# Altium footprint library CPU.PcbLib: 56 footprints (part 1 of 4)
Each footprint in its own frame and in the unit in brackets; x right, y up, seen from the top. Pads: shape width x height; smd on the part's side, far side on the other; paste and mask are expansions set on the pad; w line width, h text height; cw(c..) or ccw(c..) is an arc to the next point about the centre after c.
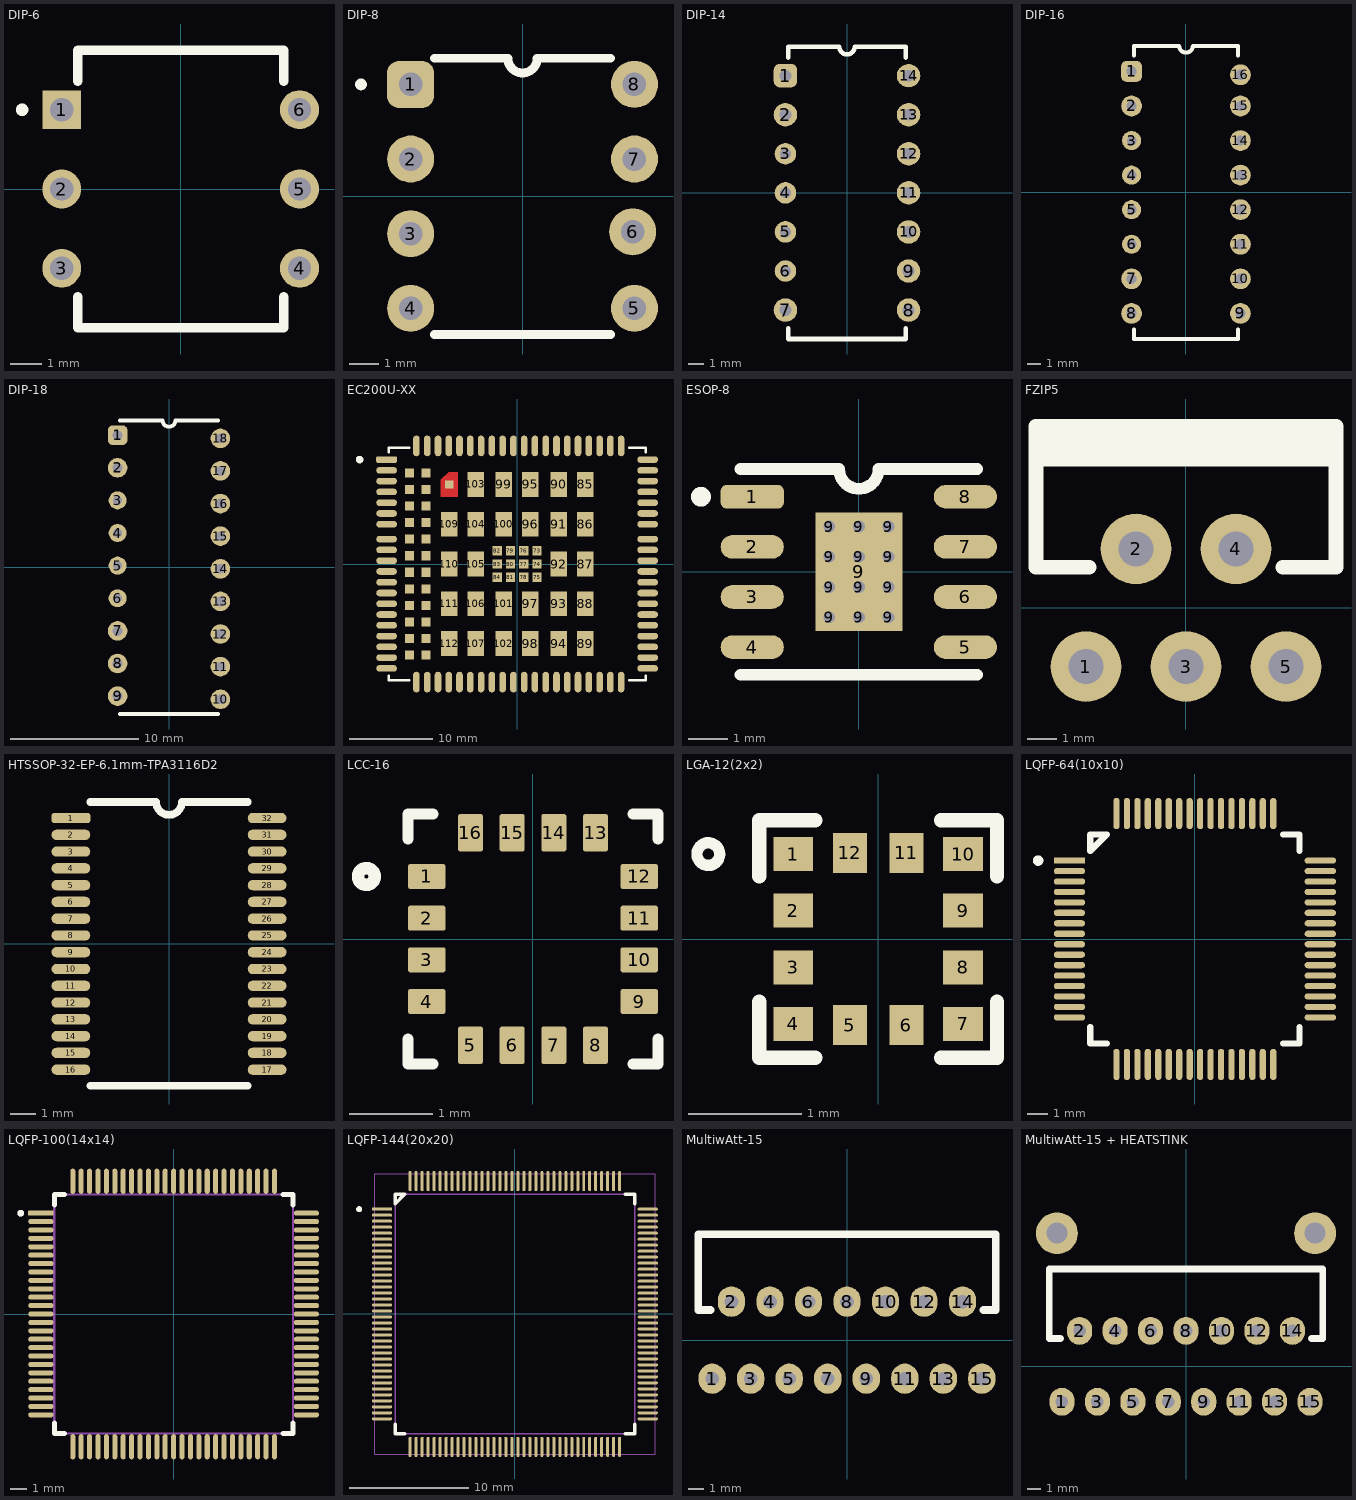
[diagram p0: the footprints below, top view; thin cyan lines are the x and y axes]

## DIP-6 [mm]
pads (6):
  rect 1.248x1.248 hole 0.74: 1(-3.81,2.54)
  round 1.248 hole 0.74: 2(-3.81,0) 3(-3.81,-2.54) 4(3.81,-2.54) 5(3.81,0) 6(3.81,2.54)
Top Overlay:
  circle w0.2: c-5.08,2.54 r0.1
  lines w0.3: -3.3,-3.45 -3.3,-4.45 3.3,-4.45 3.3,-3.45 ; -3.3,3.45 -3.3,4.45 3.3,4.45 3.3,3.45
3D body "MOC3041M.STEP": height 5.08, standoff -3.81, extent -3.935,-4.255 3.935,4.255

## DIP-8 [mm]
pads (8):
  rrect50% 1.6x1.6 hole 0.8: 1(-3.81,3.81)
  round 1.6 hole 0.8: 2(-3.81,1.27) 3(-3.81,-1.27) 4(-3.81,-3.81) 5(3.81,-3.81) 6(3.75,-1.209) 7(3.81,1.27) 8(3.81,3.81)
Top Overlay:
  circle w0.2: c-5.5,3.81 r0.1
  lines w0.3: -3.004,4.7 -0.504,4.7 ; -3,-4.7 3,-4.7 ; -0.5,4.7 ccw(c0,4.7) 0.5,4.7 ; 0.496,4.7 2.996,4.7
3D body "DIP8N.STEP": height 4.09, standoff -2.76, extent -4.254,-4.75 4.273,4.75

## DIP-14 [mil]
pads (14):
  rrect50% 60x60 hole 30 mask+5.91: 1(-157.48,300)
  round 60 hole 30 mask+5.91: 2(-157.48,200) 7(-157.48,-300) 8(157.48,-300) 9(157.48,-200) 10(157.48,-100) 11(157.48,0) 12(157.48,100) 13(157.48,200) 14(157.48,300)
  round 55.12 hole 27.56 mask+5.91: 3(-157.48,100) 4(-157.48,0) 5(-157.48,-100) 6(-157.48,-200)
Top Overlay:
  lines w11.81: -150,-346.46 -150,-374.02 150,-374.02 150,-346.46 ; -150,346.46 -150,374.02 -19.68,374.02 ccw(c0,374.02) 19.68,374.02 150,374.02 150,346.46
3D body "TL084.step": height 173.23, standoff -109.25, extent -154.92,-350 154.92,350

## DIP-16 [mil]
pads (16):
  rrect50% 60x60 hole 30 mask+5.91: 1(-157.48,350)
  round 60 hole 30 mask+5.91: 2(-157.48,250) 7(-157.48,-250) 8(-157.48,-350) 9(157.48,-350) 10(157.48,-250) 11(157.48,-150) 12(157.48,-50) 13(157.48,50) 14(157.48,150) 15(157.48,250) 16(157.48,340.3)
  round 55.12 hole 27.56 mask+5.91: 3(-157.48,150) 4(-157.48,50) 5(-157.48,-50) 6(-157.48,-150)
Top Overlay:
  lines w11.81: -150,-396.46 -150,-424.02 150,-424.02 150,-396.46 ; -150,396.46 -150,424.02 -19.68,424.02 ccw(c0,424.02) 19.69,424.02 150,424.02 150,396.46
3D body "SN74LS47NE4.STEP": height 200, standoff -129.92, extent -155.51,-420.08 155.51,420.08

## DIP-18 [mil]
pads (18):
  rrect50% 60x60 hole 30 mask+5.91: 1(-157.48,404.85)
  round 60 hole 30 mask+5.91: 2(-157.48,304.85) 7(-157.48,-195.15) 8(-157.48,-295.15) 9(-157.48,-395.15) 10(157.48,-404.85) 11(157.48,-304.85) 12(157.48,-204.85) 13(157.48,-104.85) 14(157.48,-4.85) 15(157.48,95.15) 16(157.48,195.15) 17(157.48,295.15) 18(157.48,395.15)
  round 55.12 hole 27.56 mask+5.91: 3(-157.48,204.85) 4(-157.48,104.85) 5(-157.48,4.85) 6(-157.48,-95.15)
Top Overlay:
  lines w11.81: -150,-450 150,-450 ; -150,450 -19.68,450 ccw(c0,450) 19.68,450 150,450
3D body "DIP-18.STEP": height 148.66, standoff -135.98, extent -172.24,-457.48 172.24,457.48

## EC200U-XX [mm]
pads (144):
  rrect50% 2.5x0.8 smd mask+0.15: 1(-15.75,12.6)
  oval 2.5x0.8 smd mask+0.15: 2(-15.75,11.3) 3(-15.75,10) 4(-15.75,8.7) 5(-15.75,7.4) 6(-15.75,6.1) 7(-15.75,4.8) 8(-15.75,0.4) 9(-15.75,-0.9) 10(-15.75,-2.2) 11(-15.75,-3.5) 12(-15.75,-4.8) 13(-15.75,-6.1) 14(-15.75,-7.4) 15(-15.75,-8.7) 16(-15.75,-10) 17(-15.75,-11.3) 18(-15.75,-12.6) 37(15.75,-12.6) 38(15.75,-11.3) 39(15.75,-10) 40(15.75,-8.7) 41(15.75,-7.4) 42(15.75,-6.1) 43(15.75,-4.8) 44(15.75,-3.5) 45(15.75,-2.2) 46(15.75,-0.9) 47(15.75,0.4) 48(15.75,4.8) 49(15.75,6.1) 50(15.75,7.4) 51(15.75,8.7) 52(15.75,10) 53(15.75,11.3) 54(15.75,12.6) 141(-15.75,3) 142(-15.75,1.7) 143(15.75,1.7) 144(15.75,3)
  oval 0.8x2.5 smd mask+0.15: 19(-9.55,-14.25) 20(-8.25,-14.25) 21(-6.95,-14.25) 22(-5.65,-14.25) 23(-4.35,-14.25) 24(-3.05,-14.25) 25(-1.75,-14.25) 26(-0.45,-14.25) 27(0.85,-14.25) 28(2.15,-14.25) 29(3.45,-14.25) 30(4.75,-14.25) 31(6.05,-14.25) 32(7.35,-14.25) 33(8.65,-14.25) 34(9.95,-14.25) 35(11.25,-14.25) 36(12.55,-14.25) 55(12.55,14.25) 56(11.25,14.25) 57(9.95,14.25) 58(8.65,14.25) 59(7.35,14.25) 60(6.05,14.25) 61(4.75,14.25) 62(3.45,14.25) 63(2.15,14.25) 64(0.85,14.25) 65(-0.45,14.25) 66(-1.75,14.25) 67(-3.05,14.25) 68(-4.35,14.25) 69(-5.65,14.25) 70(-6.95,14.25) 71(-8.25,14.25) 72(-9.55,14.25) 113(-10.85,14.25) 114(-12.15,14.25) 115(-10.85,-14.25) 116(-12.15,-14.25)
  rect 1.1x1.1 smd mask+0.15: 73(2.4,1.6) 74(2.4,0) 75(2.4,-1.6) 76(0.8,1.6) 77(0.8,0) 78(0.8,-1.6) 79(-0.8,1.6) 80(-0.8,0) 81(-0.8,-1.6) 82(-2.4,1.6) 83(-2.4,0) 84(-2.4,-1.6) 117(-11,11) 118(-11,9) 119(-11,7) 120(-11,5) 121(-11,3) 122(-11,1) 123(-11,-1) 124(-11,-3) 125(-11,-5) 126(-11,-7) 127(-11,-9) 128(-11,-11) 129(-13,11) 130(-13,9) 131(-13,7) 132(-13,5) 133(-13,3) 134(-13,1) 135(-13,-1) 136(-13,-3) 137(-13,-5) 138(-13,-7) 139(-13,-9) 140(-13,-11)
  rect 2x3 smd mask+0.15: 85(8.2,9.6) 86(8.2,4.8) 87(8.2,0) 88(8.2,-4.8) 89(8.2,-9.6) 90(5,9.6) 91(5,4.8) 92(5,0) 93(5,-4.8) 94(5,-9.6) 95(1.6,9.6) 96(1.6,4.8) 97(1.6,-4.8) 98(1.6,-9.6) 99(-1.6,9.6) 100(-1.6,4.8) 101(-1.6,-4.8) 102(-1.6,-9.6) 103(-5,9.6) 104(-5,4.8) 105(-5,0) 106(-5,-4.8) 107(-5,-9.6) 109(-8.2,4.8) 110(-8.2,0) 111(-8.2,-4.8) 112(-8.2,-9.6)
  rect 1x1 smd paste-1 mask+0: 108(-8.2,9.6)
Top Layer:
  region: -7.15,8.1 -9.2,8.1 -9.2,10.15 -8.25,11.1 -7.15,11.1
Top Overlay:
  circle w0.5: c-19,12.6 r0.2
  lines w0.3: -15.5,-13.5 -15.5,-14 -13,-14 ; -15.5,13.5 -15.5,14 -13,14 ; 13.5,-14 15.5,-14 15.5,-13.5 ; 13.5,14 15.5,14 15.5,13.5
Top Paste:
  region: -7.15,8.1 -9.2,8.1 -9.2,10 -8.1,11.1 -7.15,11.1
Top Solder:
  region: -7,7.95 -9.35,7.95 -9.35,10.25 -8.35,11.25 -7,11.25
3D body "EC200UCNAA-N05-SGNSA--3DModel-STEP-258128.STEP": height 2.55, standoff 0.2, extent -15.5,-14 15.5,14

## ESOP-8 [mm]
height 1.75
pads (21):
  rrect50% 1.6x0.6 smd: 1(-2.7,1.905)
  oval 1.6x0.6 smd: 2(-2.7,0.635) 3(-2.7,-0.635) 4(-2.7,-1.905) 5(2.7,-1.905) 6(2.7,-0.635) 7(2.7,0.635) 8(2.7,1.905)
  round 0.5 hole 0.3: 9(-0.75,-1.15) 9(-0.75,-0.383) 9(-0.75,0.383) 9(-0.75,1.15) 9(0,-1.15) 9(0,-0.383) 9(0,0.383) 9(0,1.15) 9(0.75,-1.15) 9(0.75,-0.383) 9(0.75,0.383) 9(0.75,1.15)
  rect 2.2x3 smd paste-3: 9(0,0)
Top Overlay:
  circle w0.3: c-4,1.905 r0.1
  lines w0.3: -3,-2.605 3,-2.605 ; -3,2.605 -0.5,2.605 ccw(c0,2.605) 0.5,2.605 3,2.605
Top Paste:
  region: 0.763,-1.044 -0.763,-1.044 -0.763,1.044 0.763,1.044
3D:
  circle w0.2: c-4,1.905 r0.1
3D body "step_temp.STEP": height 1.75, standoff 0, extent -3,-2.45 3,2.45

## FZIP5 [mm]
pads (5):
  round 2.4 hole 1.2 mask+0.2: 1(-3.4,-2) 2(-1.7,2) 3(0,-2) 4(1.7,2) 5(3.4,-2)
Top Overlay:
  rectangle: -5.1,4.805 5.1,6.175
  lines w0.5: -3.3,1.375 -5.1,1.375 -5.1,6.175 5.1,6.175 5.1,1.375 3.3,1.375
3D body "TDA2030AV.STEP": height 21.15, standoff -4.55, extent -5.2,-2.325 5.2,6.175

## HTSSOP-32-EP-6.1mm-TPA3116D2 [mm]
pads (32):
  rrect50% 1.5x0.4 smd: 1(-3.8,4.875)
  oval 1.5x0.4 smd: 2(-3.8,4.225) 3(-3.8,3.575) 4(-3.8,2.925) 5(-3.8,2.275) 6(-3.8,1.625) 7(-3.8,0.975) 8(-3.8,0.325) 9(-3.8,-0.325) 10(-3.8,-0.975) 11(-3.8,-1.625) 12(-3.8,-2.275) 13(-3.8,-2.925) 14(-3.8,-3.575) 15(-3.8,-4.225) 16(-3.8,-4.875) 17(3.8,-4.875) 18(3.8,-4.225) 19(3.8,-3.575) 20(3.8,-2.925) 21(3.8,-2.275) 22(3.8,-1.625) 23(3.8,-0.975) 24(3.8,-0.325) 25(3.8,0.325) 26(3.8,0.975) 27(3.8,1.625) 28(3.8,2.275) 29(3.8,2.925) 30(3.8,3.575) 31(3.8,4.225) 32(3.8,4.875)
Top Overlay:
  lines w0.3: -3.05,-5.5 3.05,-5.5 ; -3.05,5.5 -0.5,5.5 ccw(c0,5.5) 0.5,5.5 3.05,5.5
3D body "TPA3116D2.x_b": height 1.16, standoff 0, extent -4.15,-5.55 4.15,5.55

## LCC-16 [mm]
pads (16):
  rrect17% 0.45x0.3 smd mask+0.1: 1(-1.275,0.75) 2(-1.275,0.25) 3(-1.275,-0.25) 4(-1.275,-0.75) 9(1.275,-0.75) 10(1.275,-0.25) 11(1.275,0.25) 12(1.275,0.75)
  rrect17% 0.3x0.45 smd mask+0.1: 5(-0.75,-1.275) 6(-0.25,-1.275) 7(0.25,-1.275) 8(0.75,-1.275) 13(0.75,1.275) 14(0.25,1.275) 15(-0.25,1.275) 16(-0.75,1.275)
Top Overlay:
  circle w0.15: c-2,0.75 r0.1
  lines w0.127: -1.5,-1.2 -1.5,-1.5 -1.2,-1.5 ; -1.5,1.2 -1.5,1.5 -1.2,1.5 ; 1.2,-1.5 1.5,-1.5 1.5,-1.2 ; 1.2,1.5 1.5,1.5 1.5,1.2
3D body "HMC5883L-TR.STEP": height 0.9, standoff 0, extent -1.5,-1.5 1.5,1.5

## LGA-12(2x2) [mm]
pads (12):
  rect 0.35x0.3 smd: 1(-0.75,0.75) 2(-0.75,0.25) 3(-0.75,-0.25) 4(-0.75,-0.75) 7(0.75,-0.75) 8(0.75,-0.25) 9(0.75,0.25) 10(0.75,0.75)
  rect 0.3x0.35 smd: 5(-0.25,-0.76) 6(0.25,-0.76) 11(0.25,0.76) 12(-0.25,0.76)
Top Overlay:
  circle w0.1: c-1.5,0.75 r0.1
  lines w0.127: -1.05,-0.555 -1.05,-1.05 -0.555,-1.05 ; -1.05,0.555 -1.05,1.05 -0.555,1.05 ; 0.555,-1.05 1.05,-1.05 1.05,-0.555 ; 0.555,1.05 1.05,1.05 1.05,0.555
3D:
  circle w0.1: c-0.75,0.75 r0.05
3D body "LGA-12(2x2).STEP": height 0.7, standoff 0, extent -1,-1 1,1

## LQFP-64(10x10) [mm]
pads (64):
  rrect25% 1.5x0.3 smd: 1(-6,3.75)
  oval 1.5x0.3 smd: 2(-6,3.25) 3(-6,2.75) 4(-6,2.25) 5(-6,1.75) 6(-6,1.25) 7(-6,0.75) 8(-6,0.25) 9(-6,-0.25) 10(-6,-0.75) 11(-6,-1.25) 12(-6,-1.75) 13(-6,-2.25) 14(-6,-2.75) 15(-6,-3.25) 16(-6,-3.75) 33(6,-3.75) 34(6,-3.25) 35(6,-2.75) 36(6,-2.25) 37(6,-1.75) 38(6,-1.25) 39(6,-0.75) 40(6,-0.25) 41(6,0.25) 42(6,0.75) 43(6,1.25) 44(6,1.75) 45(6,2.25) 46(6,2.75) 47(6,3.25) 48(6,3.75)
  oval 0.3x1.5 smd: 17(-3.75,-6) 18(-3.25,-6) 19(-2.75,-6) 20(-2.25,-6) 21(-1.75,-6) 22(-1.25,-6) 23(-0.75,-6) 24(-0.25,-6) 25(0.25,-6) 26(0.75,-6) 27(1.25,-6) 28(1.75,-6) 29(2.25,-6) 30(2.75,-6) 31(3.25,-6) 32(3.75,-6) 49(3.75,6) 50(3.25,6) 51(2.75,6) 52(2.25,6) 53(1.75,6) 54(1.25,6) 55(0.75,6) 56(0.25,6) 57(-0.25,6) 58(-0.75,6) 59(-1.25,6) 60(-1.75,6) 61(-2.25,6) 62(-2.75,6) 63(-3.25,6) 64(-3.75,6)
Top Overlay:
  circle w0.3: c-7.5,3.75 r0.1
  lines w0.3: -5,-4.21 -5,-5 -4.21,-5 ; 4.21,-5 5,-5 5,-4.21 ; 4.21,5 5,5 5,4.21 ; -5,4.21 -5,5 -4.21,5 -5,4.21
3D:
  circle w0.2: c-7.5,3.75 r0.1
3D body "step_temp.STEP": height 1.6, standoff 0, extent -6,-6 6,6

## LQFP-100(14x14) [mm]
pads (100):
  rrect7% 1.5x0.3 smd: 1(-7.9,6)
  oval 1.5x0.3 smd: 2(-7.9,5.5) 3(-7.9,5) 4(-7.9,4.5) 5(-7.9,4) 6(-7.9,3.5) 7(-7.9,3) 8(-7.9,2.5) 9(-7.9,2) 10(-7.9,1.5) 11(-7.9,1) 12(-7.9,0.5) 13(-7.9,0) 14(-7.9,-0.5) 15(-7.9,-1) 16(-7.9,-1.5) 17(-7.9,-2) 18(-7.9,-2.5) 19(-7.9,-3) 20(-7.9,-3.5) 21(-7.9,-4) 22(-7.9,-4.5) 23(-7.9,-5) 24(-7.9,-5.5) 25(-7.9,-6) 51(7.9,-6) 52(7.9,-5.5) 53(7.9,-5) 54(7.9,-4.5) 55(7.9,-4) 56(7.9,-3.5) 57(7.9,-3) 58(7.9,-2.5) 59(7.9,-2) 60(7.9,-1.5) 61(7.9,-1) 62(7.9,-0.5) 63(7.9,0) 64(7.9,0.5) 65(7.9,1) 66(7.9,1.5) 67(7.9,2) 68(7.9,2.5) 69(7.9,3) 70(7.9,3.5) 71(7.9,4) 72(7.9,4.5) 73(7.9,5) 74(7.9,5.5) 75(7.9,6)
  oval 0.3x1.5 smd: 26(-6,-7.9) 27(-5.5,-7.9) 28(-5,-7.9) 29(-4.5,-7.9) 30(-4,-7.9) 31(-3.5,-7.9) 32(-3,-7.9) 33(-2.5,-7.9) 34(-2,-7.9) 35(-1.5,-7.9) 36(-1,-7.9) 37(-0.5,-7.9) 38(0,-7.9) 39(0.5,-7.9) 40(1,-7.9) 41(1.5,-7.9) 42(2,-7.9) 43(2.5,-7.9) 44(3,-7.9) 45(3.5,-7.9) 46(4,-7.9) 47(4.5,-7.9) 48(5,-7.9) 49(5.5,-7.9) 50(6,-7.9) 76(6,7.9) 77(5.5,7.9) 78(5,7.9) 79(4.5,7.9) 80(4,7.9) 81(3.5,7.9) 82(3,7.9) 83(2.5,7.9) 84(2,7.9) 85(1.5,7.9) 86(1,7.9) 87(0.5,7.9) 88(0,7.9) 89(-0.5,7.9) 90(-1,7.9) 91(-1.5,7.9) 92(-2,7.9) 93(-2.5,7.9) 94(-3,7.9) 95(-3.5,7.9) 96(-4,7.9) 97(-4.5,7.9) 98(-5,7.9) 99(-5.5,7.9) 100(-6,7.9)
Top Overlay:
  circle w0.2: c-9.1,6 r0.1
  lines w0.3: -7.1,-6.5 -7.1,-7.1 -6.5,-7.1 ; -7.1,6.5 -7.1,7.1 -6.5,7.1 ; 6.5,-7.1 7.1,-7.1 7.1,-6.5 ; 6.5,7.1 7.1,7.1 7.1,6.5
3D:
  circle w0.2: c-9.1,6 r0.1
  lines w0.127: -7.1,-7.1 7.1,-7.1 7.1,7.1 -7.1,7.1 -7.1,-7.1
3D body "step_temp.STEP": height 1.63, standoff 0.03, extent -8,-8 8,8

## LQFP-144(20x20) [mm]
pads (144):
  rrect25% 1.7x0.25 smd: 1(-11.1,8.75)
  oval 1.7x0.25 smd: 2(-11.1,8.25) 3(-11.1,7.75) 4(-11.1,7.25) 5(-11.1,6.75) 6(-11.1,6.25) 7(-11.1,5.75) 8(-11.1,5.25) 9(-11.1,4.75) 10(-11.1,4.25) 11(-11.1,3.75) 12(-11.1,3.25) 13(-11.1,2.75) 14(-11.1,2.25) 15(-11.1,1.75) 16(-11.1,1.25) 17(-11.1,0.75) 18(-11.1,0.25) 19(-11.1,-0.25) 20(-11.1,-0.75) 21(-11.1,-1.25) 22(-11.1,-1.75) 23(-11.1,-2.25) 24(-11.1,-2.75) 25(-11.1,-3.25) 26(-11.1,-3.75) 27(-11.1,-4.25) 28(-11.1,-4.75) 29(-11.1,-5.25) 30(-11.1,-5.75) 31(-11.1,-6.25) 32(-11.1,-6.75) 33(-11.1,-7.25) 34(-11.1,-7.75) 35(-11.1,-8.25) 36(-11.1,-8.75) 73(11.1,-8.75) 74(11.1,-8.25) 75(11.1,-7.75) 76(11.1,-7.25) 77(11.1,-6.75) 78(11.1,-6.25) 79(11.1,-5.75) 80(11.1,-5.25) 81(11.1,-4.75) 82(11.1,-4.25) 83(11.1,-3.75) 84(11.1,-3.25) 85(11.1,-2.75) 86(11.1,-2.25) 87(11.1,-1.75) 88(11.1,-1.25) 89(11.1,-0.75) 90(11.1,-0.25) 91(11.1,0.25) 92(11.1,0.75) 93(11.1,1.25) 94(11.1,1.75) 95(11.1,2.25) 96(11.1,2.75) 97(11.1,3.25) 98(11.1,3.75) 99(11.1,4.25) 100(11.1,4.75) 101(11.1,5.25) 102(11.1,5.75) 103(11.1,6.25) 104(11.1,6.75) 105(11.1,7.25) 106(11.1,7.75) 107(11.1,8.25) 108(11.1,8.75)
  oval 0.25x1.7 smd: 37(-8.75,-11.1) 38(-8.25,-11.1) 39(-7.75,-11.1) 40(-7.25,-11.1) 41(-6.75,-11.1) 42(-6.25,-11.1) 43(-5.75,-11.1) 44(-5.25,-11.1) 45(-4.75,-11.1) 46(-4.25,-11.1) 47(-3.75,-11.1) 48(-3.25,-11.1) 49(-2.75,-11.1) 50(-2.25,-11.1) 51(-1.75,-11.1) 52(-1.25,-11.1) 53(-0.75,-11.1) 54(-0.25,-11.1) 55(0.25,-11.1) 56(0.75,-11.1) 57(1.25,-11.1) 58(1.75,-11.1) 59(2.25,-11.1) 60(2.75,-11.1) 61(3.25,-11.1) 62(3.75,-11.1) 63(4.25,-11.1) 64(4.75,-11.1) 65(5.25,-11.1) 66(5.75,-11.1) 67(6.25,-11.1) 68(6.75,-11.1) 69(7.25,-11.1) 70(7.75,-11.1) 71(8.25,-11.1) 72(8.75,-11.1) 109(8.75,11.1) 110(8.25,11.1) 111(7.75,11.1) 112(7.25,11.1) 113(6.75,11.1) 114(6.25,11.1) 115(5.75,11.1) 116(5.25,11.1) 117(4.75,11.1) 118(4.25,11.1) 119(3.75,11.1) 120(3.25,11.1) 121(2.75,11.1) 122(2.25,11.1) 123(1.75,11.1) 124(1.25,11.1) 125(0.75,11.1) 126(0.25,11.1) 127(-0.25,11.1) 128(-0.75,11.1) 129(-1.25,11.1) 130(-1.75,11.1) 131(-2.25,11.1) 132(-2.75,11.1) 133(-3.25,11.1) 134(-3.75,11.1) 135(-4.25,11.1) 136(-4.75,11.1) 137(-5.25,11.1) 138(-5.75,11.1) 139(-6.25,11.1) 140(-6.75,11.1) 141(-7.25,11.1) 142(-7.75,11.1) 143(-8.25,11.1) 144(-8.75,11.1)
Top Overlay:
  circle w0.3: c-13,8.75 r0.1
  lines w0.3: -10,-9.21 -10,-10 -9.21,-10 ; 9.21,-10 10,-10 10,-9.21 ; 9.21,10 10,10 10,9.21 ; -10,9.21 -9.21,10 -10,10 -10,9.21
3D:
  lines w0.127: -10,-10 10,-10 10,10 -10,10 -10,-10
Mechanical 15:
  lines w0.05: -11.71,-11.71 11.71,-11.71 11.71,11.71 -11.71,11.71 -11.71,-11.71
3D body "step_temp.STEP": height 1.6, standoff 0, extent -11,-11 11,11

## MultiwAtt-15 [mm]
pads (15):
  oval 1.8x2 hole 0.9 mask+0.2: 1(-8.89,-2.54) 2(-7.62,2.54) 3(-6.35,-2.54) 4(-5.08,2.54) 5(-3.81,-2.54) 6(-2.54,2.54) 7(-1.27,-2.54) 8(0,2.54) 9(1.27,-2.54) 10(2.54,2.54) 11(3.81,-2.54) 12(5.08,2.54) 13(6.35,-2.54) 14(7.62,2.54) 15(8.89,-2.54)
Top Overlay:
  lines w0.5: -9,1.99 -9.8,1.99 -9.8,6.99 9.8,6.99 9.8,1.99 9,1.99
3D body "MULTIWATT-15_Normal_LStrandard_rev1.1.STEP": height 21, standoff -2.02, extent -9.9,-2.935 9.9,6.99

## MultiwAtt-15 + HEATSTINK [mm]
pads (17):
  oval 1.8x2 hole 0.9 mask+0.2: 1(-8.89,-2.54) 2(-7.62,2.54) 3(-6.35,-2.54) 4(-5.08,2.54) 5(-3.81,-2.54) 6(-2.54,2.54) 7(-1.27,-2.54) 8(0,2.54) 9(1.27,-2.54) 10(2.54,2.54) 11(3.81,-2.54) 12(5.08,2.54) 13(6.35,-2.54) 14(7.62,2.54) 15(8.89,-2.54)
  round 3 hole 1.5 mask+0.2: ""(-9.25,9.54) ""(9.25,9.54)
Top Overlay:
  lines w0.5: -9,1.99 -9.8,1.99 -9.8,6.99 9.8,6.99 9.8,1.99 9,1.99
3D body "L298N_Heatsink_axisY.step": height 25.7, standoff -3.3, extent -11.5,-1 11.5,16.02